# Altium footprint library Generic Footprint.PcbLib: 160 footprints (part 18 of 20) (continued)
## Symbol_FCC-Logo-15x10_Silkscreen [mil] (continued)
1(293.79,306.16) 1(293.79,306.83) 1(293.79,307.5) 1(293.79,373.09) 1(293.79,373.76) 1(293.79,374.42) 1(294.46,35.09) 1(294.46,35.76) 1(294.46,100.68) 1(294.46,102.02) 1(294.46,102.69) 1(294.46,145.53) 1(294.46,146.87) 1(294.46,148.2) 1(294.46,148.87) 1(294.46,149.54) 1(294.46,259.31) 1(294.46,259.98) 1(294.46,260.65) 1(294.46,263.32) 1(294.46,305.49) 1(294.46,306.83) 1(295.13,33.76) 1(295.13,34.42) 1(295.13,35.09) 1(295.13,100.02) 1(295.13,101.35) 1(295.13,102.02) 1(295.13,144.86) 1(295.13,146.87) 1(295.13,262.65) 1(295.13,306.16) 1(295.13,307.5) 1(295.13,308.17) 1(295.13,373.76) 1(295.13,374.42) 1(295.13,375.09) 1(295.8,33.09) 1(295.8,99.35) 1(295.8,100.68) 1(295.8,101.35) 1(295.8,143.52) 1(295.8,144.19) 1(295.8,144.86) 1(295.8,145.53) 1(295.8,262.65) 1(295.8,263.99) 1(295.8,264.66) 1(295.8,265.33) 1(295.8,306.83) 1(295.8,308.17) 1(295.8,308.83) 1(295.8,374.42) 1(295.8,375.76) 1(296.47,34.42) 1(296.47,98.68) 1(296.47,99.35) 1(296.47,100.02) 1(296.47,100.68) 1(296.47,142.18) 1(296.47,143.52) 1(296.47,144.86) 1(296.47,145.53) 1(296.47,264.66) 1(296.47,265.33) 1(296.47,266.67) 1(296.47,307.5) 1(296.47,308.17) 1(296.47,308.83) 1(296.47,376.43) 1(297.14,31.75) 1(297.14,32.42) 1(297.14,33.09) 1(297.14,100.02) 1(297.14,142.18) 1(297.14,142.85) 1(297.14,143.52) 1(297.14,264.66) 1(297.14,265.33) 1(297.14,266.67) 1(297.14,268.01) 1(297.14,268.68) 1(297.14,308.83) 1(297.81,32.42) 1(297.81,33.09) 1(297.81,98.68) 1(297.81,99.35) 1(297.81,140.17) 1(297.81,142.18) 1(297.81,266) 1(297.81,266.67) 1(297.81,268.01) 1(297.81,310.84) 1(297.81,377.1) 1(298.48,31.08) 1(298.48,97.34) 1(298.48,138.17) 1(298.48,138.83) 1(298.48,141.51) 1(298.48,267.34) 1(298.48,268.68) 1(298.48,270.02) 1(298.48,270.68) 1(298.48,309.5) 1(298.48,310.84) 1(298.48,311.51) 1(299.15,31.75) 1(299.15,32.42) 1(299.15,96) 1(299.15,96.67) 1(299.15,97.34) 1(299.15,98.68) 1(299.15,138.83) 1(299.15,140.17) 1(299.15,140.84) 1(299.15,268.01) 1(299.15,268.68) 1(299.15,269.35) 1(299.15,310.17) 1(299.15,312.18) 1(299.15,377.77) 1(299.82,31.75) 1(299.82,95.33) 1(299.82,96.67) 1(299.82,97.34) 1(299.82,98.01) 1(299.82,136.16) 1(299.82,136.83) 1(299.82,138.17) 1(299.82,139.5) 1(299.82,140.17) 1(299.82,270.02) 1(299.82,270.68) 1(299.82,271.35) 1(299.82,272.02) 1(299.82,272.69) 1(299.82,310.84) 1(299.82,311.51) 1(299.82,312.18) 1(299.82,312.85) 1(299.82,377.1) 1(299.82,378.44) 1(300.49,29.74) 1(300.49,30.41) 1(300.49,94.66) 1(300.49,96) 1(300.49,96.67) 1(300.49,135.49) 1(300.49,137.5) 1(300.49,138.17) 1(300.49,138.83) 1(300.49,270.02) 1(300.49,270.68) 1(300.49,273.36) 1(300.49,311.51) 1(300.49,312.18) 1(300.49,312.85) 1(300.49,313.52) 1(300.49,314.19) 1(300.49,377.1) 1(301.16,93.99) 1(301.16,95.33) 1(301.16,96) 1(301.16,134.15) 1(301.16,134.82) 1(301.16,274.03) 1(301.16,313.52) 1(301.16,377.77) 1(301.16,378.44) 1(301.16,379.11) 1(301.83,29.07) 1(301.83,94.66) 1(301.83,95.33) 1(301.83,133.48) 1(301.83,274.7) 1(301.83,275.37) 1(301.83,312.85) 1(301.83,314.19) 1(301.83,314.86) 1(302.49,93.99) 1(302.49,94.66) 1(302.49,132.81) 1(302.49,134.15) 1(302.49,134.82) 1(302.49,274.03) 1(302.49,274.7) 1(302.49,276.04) 1(302.49,313.52) 1(302.49,314.86) 1(302.49,377.77) 1(302.49,379.11) 1(302.49,379.78) 1(303.16,28.4) 1(303.16,29.74) 1(303.16,91.98) 1(303.16,92.65) 1(303.16,93.99) 1(303.16,133.48) 1(303.16,134.15) 1(303.16,134.82) 1(303.16,274.03) 1(303.16,274.7) 1(303.16,275.37) 1(303.16,314.19) 1(303.16,314.86) 1(303.16,378.44) 1(303.83,29.07) 1(303.83,29.74) 1(303.83,91.98) 1(303.83,92.65) 1(303.83,93.32) 1(303.83,130.13) 1(303.83,130.8) 1(303.83,132.81) 1(303.83,133.48) 1(303.83,275.37) 1(303.83,276.04) 1(303.83,277.38) 1(303.83,278.05) 1(303.83,315.53) 1(303.83,316.87) 1(303.83,379.11) 1(303.83,380.45) 1(304.5,92.65) 1(304.5,129.46) 1(304.5,130.8) 1(304.5,132.14) 1(304.5,132.81) 1(304.5,276.04) 1(304.5,276.71) 1(304.5,277.38) 1(304.5,278.05) 1(304.5,278.72) 1(304.5,316.87) 1(304.5,317.54) 1(304.5,381.12) 1(305.17,27.73) 1(305.17,28.4) 1(305.17,29.07) 1(305.17,131.47) 1(305.17,277.38) 1(305.17,279.39) 1(305.17,316.2) 1(305.17,317.54) 1(305.17,380.45) 1(305.84,89.98) 1(305.84,90.65) 1(305.84,91.98) 1(305.84,128.13) 1(305.84,128.79) 1(305.84,130.8) 1(305.84,278.05) 1(305.84,280.05) 1(305.84,280.72) 1(305.84,316.87) 1(305.84,381.79) 1(306.51,89.31) 1(306.51,90.65) 1(306.51,127.46) 1(306.51,128.79) 1(306.51,280.05) 1(306.51,281.39) 1(306.51,317.54) 1(306.51,318.87) 1(306.51,319.54) 1(306.51,380.45) 1(306.51,381.12) 1(306.51,382.46) 1(307.18,26.39) 1(307.18,27.06) 1(307.18,27.73) 1(307.18,28.4) 1(307.18,88.64) 1(307.18,89.98) 1(307.18,90.65) 1(307.18,91.31) 1(307.18,126.79) 1(307.18,127.46) 1(307.18,128.13) 1(307.18,128.79) 1(307.18,280.05) 1(307.18,280.72) 1(307.18,281.39) 1(307.18,282.06) 1(307.18,318.2) 1(307.18,318.87) 1(307.18,381.12) 1(307.85,25.72) 1(307.85,26.39) 1(307.85,27.06) 1(307.85,27.73) 1(307.85,87.97) 1(307.85,89.31) 1(307.85,89.98) 1(307.85,126.12) 1(307.85,126.79) 1(307.85,128.13) 1(307.85,280.72) 1(307.85,281.39) 1(307.85,282.06) 1(307.85,282.73) 1(307.85,318.87) 1(307.85,319.54) 1(307.85,320.21) 1(307.85,383.13) 1(308.52,26.39) 1(308.52,27.06) 1(308.52,88.64) 1(308.52,89.31) 1(308.52,125.45) 1(308.52,126.12) 1(308.52,127.46) 1(308.52,320.21) 1(308.52,320.88) 1(309.19,25.05) 1(309.19,87.97) 1(309.19,88.64) 1(309.19,125.45) 1(309.19,126.79) 1(309.19,282.06) 1(309.19,282.73) 1(309.19,284.07) 1(309.19,284.74) 1(309.19,319.54) 1(309.19,320.88) 1(309.86,86.63) 1(309.86,87.3) 1(309.86,122.77) 1(309.86,123.44) 1(309.86,124.11) 1(309.86,126.12) 1(309.86,282.73) 1(309.86,284.07) 1(309.86,284.74) 1(309.86,285.41) 1(309.86,320.21) 1(309.86,382.46) 1(309.86,383.8) 1(310.53,24.39) 1(310.53,87.3) 1(310.53,122.1) 1(310.53,123.44) 1(310.53,124.11) 1(310.53,124.78) 1(310.53,125.45) 1(310.53,283.4) 1(310.53,284.07) 1(310.53,284.74) 1(310.53,285.41) 1(310.53,286.08) 1(310.53,322.22) 1(310.53,382.46) 1(310.53,383.13) 1(311.2,86.63) 1(311.2,87.3) 1(311.2,87.97) 1(311.2,122.77) 1(311.2,123.44) 1(311.2,124.11) 1(311.2,285.41) 1(311.2,286.08) 1(311.2,286.75) 1(311.2,320.88) 1(311.2,322.22) 1(311.2,384.46) 1(311.86,23.72) 1(311.86,86.63) 1(311.86,121.43) 1(311.86,122.1) 1(311.86,287.42) 1(311.86,321.55) 1(311.86,323.56) 1(311.86,383.13) 1(311.86,383.8) 1(312.53,85.96) 1(312.53,120.76) 1(312.53,122.77) 1(312.53,286.08) 1(312.53,286.75) 1(312.53,288.09) 1(312.53,322.22) 1(312.53,323.56) 1(313.2,84.62) 1(313.2,120.09) 1(313.2,120.76) 1(313.2,121.43) 1(313.2,122.1) 1(313.2,286.75) 1(313.2,287.42) 1(313.2,288.76) 1(313.2,322.89) 1(313.2,324.23) 1(313.2,383.8) 1(313.2,385.13) 1(313.87,23.05) 1(313.87,24.39) 1(313.87,83.95) 1(313.87,84.62) 1(313.87,119.42) 1(313.87,120.09) 1(313.87,121.43) 1(313.87,287.42) 1(313.87,288.76) 1(313.87,289.42) 1(313.87,324.9) 1(313.87,384.46) 1(313.87,385.13) 1(313.87,385.8) 1(314.54,22.38) 1(314.54,24.39) 1(314.54,83.28) 1(314.54,83.95) 1(314.54,85.29) 1(314.54,118.76) 1(314.54,119.42) 1(314.54,120.09) 1(314.54,120.76) 1(314.54,288.76) 1(314.54,289.42) 1(314.54,290.09) 1(314.54,323.56) 1(314.54,324.23) 1(314.54,324.9) 1(314.54,384.46) 1(314.54,385.13) 1(315.21,23.05) 1(315.21,23.72) 1(315.21,82.61) 1(315.21,83.28) 1(315.21,83.95) 1(315.21,84.62) 1(315.21,118.09) 1(315.21,290.76) 1(315.21,324.23) 1(315.21,326.24) 1(315.21,385.13) 1(315.21,385.8) 1(315.21,386.47) 1(315.88,23.72) 1(315.88,81.94) 1(315.88,82.61) 1(315.88,83.28) 1(315.88,117.42) 1(315.88,118.76) 1(315.88,119.42) 1(315.88,289.42) 1(315.88,290.09) 1(315.88,291.43) 1(315.88,324.9) 1(315.88,326.24) 1(315.88,385.13) 1(316.55,21.71) 1(316.55,22.38) 1(316.55,23.05) 1(316.55,116.08) 1(316.55,116.75) 1(316.55,118.76) 1(316.55,290.09) 1(316.55,290.76) 1(316.55,291.43) 1(316.55,292.1) 1(316.55,385.8) 1(316.55,386.47) 1(316.55,387.14) 1(317.22,81.94) 1(317.22,115.41) 1(317.22,116.75) 1(317.22,290.76) 1(317.22,292.1) 1(317.22,292.77) 1(317.22,325.57) 1(317.89,82.61) 1(317.89,116.08) 1(317.89,116.75) 1(317.89,291.43) 1(317.89,292.1) 1(317.89,292.77) 1(317.89,293.44) 1(317.89,326.24) 1(317.89,386.47) 1(317.89,387.14) 1(317.89,387.81) 1(318.56,21.04) 1(318.56,21.71) 1(318.56,22.38) 1(318.56,114.74) 1(318.56,115.41) 1(318.56,294.11) 1(318.56,327.57) 1(319.23,81.94) 1(319.23,114.07) 1(319.23,114.74) 1(319.23,116.08) 1(319.23,292.77) 1(319.23,293.44) 1(319.23,294.78) 1(319.23,326.91) 1(319.23,327.57) 1(319.23,328.24) 1(319.23,387.14) 1(319.23,388.48) 1(319.9,20.37) 1(319.9,21.71) 1(319.9,81.28) 1(319.9,113.4) 1(319.9,114.07) 1(319.9,115.41) 1(319.9,293.44) 1(319.9,294.11) 1(319.9,295.45) 1(319.9,327.57) 1(319.9,328.24) 1(319.9,329.58) 1(320.57,21.04) 1(320.57,80.61) 1(320.57,112.73) 1(320.57,113.4) 1(320.57,114.74) 1(320.57,294.11) 1(320.57,295.45) 1(320.57,296.12) 1(320.57,328.24) 1(321.23,19.7) 1(321.23,21.04) 1(321.23,78.6) 1(321.23,112.06) 1(321.23,112.73) 1(321.23,113.4) 1(321.23,114.07) 1(321.23,295.45) 1(321.23,296.12) 1(321.23,296.79) 1(321.23,329.58) 1(321.23,330.25) 1(321.23,389.15) 1(321.9,19.03) 1(321.9,79.94) 1(321.9,111.39) 1(321.9,297.46) 1(321.9,328.91) 1(322.57,77.93) 1(322.57,78.6) 1(322.57,79.27) 1(322.57,112.06) 1(322.57,112.73) 1(322.57,296.12) 1(322.57,296.79) 1(322.57,329.58) 1(322.57,330.25) 1(322.57,330.92) 1(322.57,389.82) 1(323.24,18.36) 1(323.24,77.26) 1(323.24,110.05) 1(323.24,110.72) 1(323.24,111.39) 1(323.24,389.15) 1(323.91,77.26) 1(323.91,77.93) 1(323.91,78.6) 1(323.91,111.39) 1(323.91,112.06) 1(323.91,296.79) 1(323.91,297.46) 1(323.91,298.8) 1(323.91,330.25) 1(323.91,330.92) 1(323.91,389.15) 1(324.58,75.92) 1(324.58,77.93) 1(324.58,109.39) 1(324.58,110.05) 1(324.58,297.46) 1(324.58,298.13) 1(324.58,298.8) 1(324.58,299.46) 1(324.58,389.82) 1(324.58,390.49) 1(325.25,19.03) 1(325.25,108.72) 1(325.25,109.39) 1(325.25,300.13) 1(325.25,330.92) 1(325.92,17.69) 1(325.92,19.03) 1(325.92,75.92) 1(325.92,77.26) 1(325.92,110.05) 1(325.92,298.8) 1(325.92,299.46) 1(325.92,300.8) 1(325.92,331.59) 1(326.59,18.36) 1(326.59,75.25) 1(326.59,108.05) 1(326.59,109.39) 1(326.59,299.46) 1(326.59,300.13) 1(326.59,389.82) 1(326.59,390.49) 1(326.59,391.16) 1(327.26,76.59) 1(327.26,107.38) 1(327.26,108.72) 1(327.26,300.13) 1(327.26,301.47) 1(327.26,332.26) 1(327.26,333.6) 1(327.93,75.25) 1(327.93,106.04) 1(327.93,106.71) 1(327.93,107.38) 1(327.93,108.05) 1(327.93,108.72) 1(327.93,302.14) 1(327.93,333.6) 1(327.93,334.27) 1(327.93,390.49) 1(327.93,391.16) 1(327.93,391.83) 1(328.6,17.02) 1(328.6,18.36) 1(328.6,75.92) 1(328.6,108.05) 1(328.6,302.81) 1(328.6,332.93) 1(329.27,16.35) 1(329.27,17.69) 1(329.27,75.25) 1(329.27,105.37) 1(329.27,107.38) 1(329.27,302.14) 1(329.27,334.27) 1(329.27,392.5) 1(329.94,16.35) 1(329.94,17.69) 1(329.94,197.06) 1(329.94,197.73) 1(329.94,198.4) 1(329.94,199.07) 1(329.94,199.74) 1(329.94,200.41) 1(329.94,201.08) 1(329.94,201.75) 1(329.94,202.42) 1(329.94,203.09) 1(329.94,203.76) 1(329.94,204.42) 1(329.94,205.09) 1(329.94,205.76) 1(329.94,206.43) 1(329.94,207.1) 1(329.94,207.77) 1(329.94,208.44) 1(329.94,209.11) 1(329.94,209.78) 1(329.94,210.45) 1(329.94,211.12) 1(329.94,303.48) 1(329.94,333.6) 1(329.94,334.94) 1(329.94,335.61) 1(330.61,15.68) 1(330.61,17.02) 1(330.61,74.58) 1(330.61,104.7) 1(330.61,105.37) 1(330.61,106.04) 1(330.61,192.38) 1(330.61,193.05) 1(330.61,193.72) 1(330.61,194.39) 1(330.61,195.05) 1(330.61,195.72) 1(330.61,196.39) 1(330.61,197.73) 1(330.61,198.4) 1(330.61,199.07) 1(330.61,199.74) 1(330.61,200.41) 1(330.61,201.08) 1(330.61,201.75) 1(330.61,202.42) 1(330.61,203.09) 1(330.61,203.76) 1(330.61,204.42) 1(330.61,205.09) 1(330.61,205.76) 1(330.61,206.43) 1(330.61,207.1) 1(330.61,207.77) 1(330.61,208.44) 1(330.61,209.11) 1(330.61,209.78) 1(330.61,210.45) 1(330.61,211.12) 1(330.61,211.79) 1(330.61,212.46) 1(330.61,213.13) 1(330.61,213.79) 1(330.61,214.46) 1(330.61,215.13) 1(330.61,215.8) 1(330.61,216.47) 1(330.61,302.14) 1(330.61,302.81) 1(330.61,304.15) 1(330.61,334.27) 1(330.61,335.61) 1(330.61,391.16) 1(330.61,391.83) 1(330.61,392.5) 1(330.61,393.17) 1(331.27,72.57) 1(331.27,73.91) 1(331.27,106.04) 1(331.27,192.38) 1(331.27,193.05) 1(331.27,193.72) 1(331.27,194.39) 1(331.27,195.05) 1(331.27,195.72) 1(331.27,196.39) 1(331.27,197.73) 1(331.27,198.4) 1(331.27,199.07) 1(331.27,199.74) 1(331.27,200.41) 1(331.27,201.08) 1(331.27,201.75) 1(331.27,202.42) 1(331.27,203.09) 1(331.27,203.76) 1(331.27,204.42) 1(331.27,205.09) 1(331.27,205.76) 1(331.27,206.43) 1(331.27,207.1) 1(331.27,207.77) 1(331.27,208.44) 1(331.27,209.11) 1(331.27,209.78) 1(331.27,210.45) 1(331.27,211.12) 1(331.27,212.46) 1(331.27,213.13) 1(331.27,213.79) 1(331.27,214.46) 1(331.27,215.13) 1(331.27,215.8) 1(331.27,216.47) 1(331.27,302.81) 1(331.27,303.48) 1(331.27,304.82) 1(331.27,334.94) 1(331.27,336.28) 1(331.94,104.03) 1(331.94,192.38) 1(331.94,193.05) 1(331.94,193.72) 1(331.94,194.39) 1(331.94,195.05) 1(331.94,195.72) 1(331.94,213.13) 1(331.94,213.79) 1(331.94,214.46) 1(331.94,215.13) 1(331.94,215.8) 1(331.94,303.48) 1(331.94,304.15) 1(331.94,305.49) 1(331.94,334.94) 1(331.94,391.83) 1(331.94,392.5) 1(332.61,15.02) 1(332.61,15.68) 1(332.61,16.35) 1(332.61,17.02) 1(332.61,71.91) 1(332.61,72.57) 1(332.61,73.24) 1(332.61,103.36) 1(332.61,105.37) 1(332.61,183.68) 1(332.61,185.02) 1(332.61,196.39) 1(332.61,212.46) 1(332.61,216.47) 1(332.61,223.83) 1(332.61,225.17) 1(332.61,304.82) 1(332.61,336.28) 1(332.61,336.94) 1(332.61,393.83) 1(333.28,102.69) 1(333.28,103.36) 1(333.28,104.03) 1(333.28,181) 1(333.28,181.67) 1(333.28,182.34) 1(333.28,183.68) 1(333.28,185.02) 1(333.28,188.36) 1(333.28,189.03) 1(333.28,189.7) 1(333.28,190.37) 1(333.28,191.04) 1(333.28,191.71) 1(333.28,217.14) 1(333.28,217.81) 1(333.28,218.48) 1(333.28,219.15) 1(333.28,219.82) 1(333.28,223.83) 1(333.28,225.17) 1(333.28,225.84) 1(333.28,226.51) 1(333.28,227.18) 1(333.28,227.85) 1(333.28,304.15) 1(333.28,304.82) 1(333.28,306.16) 1(333.28,335.61) 1(333.28,336.94) 1(333.28,337.61) 1(333.95,71.24) 1(333.95,72.57) 1(333.95,178.99) 1(333.95,179.66) 1(333.95,180.33) 1(333.95,181) 1(333.95,181.67) 1(333.95,182.34) 1(333.95,185.68) 1(333.95,186.35) 1(333.95,187.02) 1(333.95,187.69) 1(333.95,220.49) 1(333.95,221.16) 1(333.95,221.83) 1(333.95,222.5) 1(333.95,223.17) 1(333.95,225.84) 1(333.95,226.51) 1(333.95,227.18) 1(333.95,227.85) 1(333.95,228.52) 1(333.95,229.19) 1(333.95,229.86) 1(333.95,306.83) 1(333.95,336.28) 1(333.95,394.5) 1(334.62,14.35) 1(334.62,15.02) 1(334.62,15.68) 1(334.62,71.91) 1(334.62,102.02) 1(334.62,102.69) 1(334.62,103.36) 1(334.62,104.03) 1(334.62,177.65) 1(334.62,178.32) 1(334.62,178.99) 1(334.62,179.66) 1(334.62,180.33) 1(334.62,182.34) 1(334.62,183.01) 1(334.62,183.68) 1(334.62,184.35) 1(334.62,185.02) 1(334.62,223.83) 1(334.62,224.5) 1(334.62,225.17) 1(334.62,225.84) 1(334.62,226.51) 1(334.62,228.52) 1(334.62,229.19) 1(334.62,229.86) 1(334.62,230.53) 1(334.62,231.2) 1(334.62,337.61) 1(335.29,71.24) 1(335.29,101.35) 1(335.29,176.98) 1(335.29,178.99) 1(335.29,180.33) 1(335.29,181) 1(335.29,181.67) 1(335.29,227.18) 1(335.29,227.85) 1(335.29,228.52) 1(335.29,229.86) 1(335.29,231.87) 1(335.29,307.5) 1(335.96,69.9) 1(335.96,70.57) 1(335.96,71.91) 1(335.96,102.02) 1(335.96,102.69) 1(335.96,175.65) 1(335.96,176.31) 1(335.96,176.98) 1(335.96,177.65) 1(335.96,178.32) 1(335.96,179.66) 1(335.96,229.19) 1(335.96,230.53) 1(335.96,231.2) 1(335.96,232.54) 1(335.96,233.2) 1(335.96,306.83) 1(335.96,336.94) 1(336.63,15.02) 1(336.63,69.9) 1(336.63,70.57) 1(336.63,174.31) 1(336.63,174.98) 1(336.63,175.65) 1(336.63,176.98) 1(336.63,177.65) 1(336.63,178.32) 1(336.63,230.53) 1(336.63,231.2) 1(336.63,232.54) 1(336.63,233.87) 1(336.63,234.54) 1(336.63,308.17) 1(336.63,395.17) 1(337.3,13.68) 1(337.3,69.23) 1(337.3,69.9) 1(337.3,71.24) 1(337.3,100.02) 1(337.3,100.68) 1(337.3,102.02) 1(337.3,173.64) 1(337.3,174.31) 1(337.3,174.98) 1(337.3,175.65) 1(337.3,232.54) 1(337.3,233.87) 1(337.3,234.54) 1(337.3,235.21) 1(337.3,306.83) 1(337.3,337.61) 1(337.97,13.01) 1(337.97,69.9) 1(337.97,70.57) 1(337.97,99.35) 1(337.97,174.31) 1(337.97,174.98) 1(337.97,233.87) 1(337.97,234.54) 1(337.97,308.17) 1(337.97,308.83) 1(337.97,309.5) 1(337.97,338.28) 1(337.97,395.84) 1(338.64,12.34) 1(338.64,69.23) 1(338.64,170.29) 1(338.64,172.3) 1(338.64,236.55) 1(338.64,308.83) 1(338.64,394.5) 1(339.31,98.68) 1(339.31,168.28) 1(339.31,168.95) 1(339.31,169.62) 1(339.31,170.29) 1(339.31,172.97) 1(339.31,235.88) 1(339.31,239.23) 1(339.31,239.9) 1(339.31,240.57) 1(339.31,308.17) 1(339.31,309.5) 1(339.31,339.62) 1(339.98,69.9) 1(339.98,99.35) 1(339.98,167.61) 1(339.98,168.95) 1(339.98,169.62) 1(339.98,170.29) 1(339.98,170.96) 1(339.98,171.63) 1(339.98,237.22) 1(339.98,237.89) 1(339.98,239.23) 1(339.98,239.9) 1(339.98,241.24) 1(339.98,241.91) 1(339.98,308.83) 1(339.98,310.17) 1(339.98,338.95) 1(339.98,339.62) 1(339.98,340.29) 1(339.98,394.5) 1(340.64,166.28) 1(340.64,166.94) 1(340.64,167.61) 1(340.64,168.28) 1(340.64,168.95) 1(340.64,169.62) 1(340.64,238.56) 1(340.64,239.23) 1(340.64,241.24) 1(340.64,242.57) 1(340.64,395.17) 1(340.64,395.84) 1(340.64,396.51) 1(341.31,69.23) 1(341.31,98.01) 1(341.31,98.68) 1(341.31,99.35) 1(341.31,166.28) 1(341.31,166.94) 1(341.31,167.61) 1(341.31,168.28) 1(341.31,239.9) 1(341.31,241.24) 1(341.31,241.91) 1(341.31,243.24) 1(341.31,309.5) 1(341.31,310.17) 1(341.31,310.84) 1(341.31,339.62) 1(341.31,340.29) 1(341.31,340.96) 1(341.98,11.67) 1(341.98,67.89) 1(341.98,164.94) 1(341.98,165.61) 1(341.98,166.94) 1(341.98,243.91) 1(342.65,67.22) 1(342.65,67.89) 1(342.65,68.56) 1(342.65,98.01) 1(342.65,98.68) 1(342.65,163.6) 1(342.65,164.27) 1(342.65,164.94) 1(342.65,166.28) 1(342.65,241.91) 1(342.65,243.91) 1(342.65,244.58) 1(342.65,245.25) 1(342.65,310.17) 1(342.65,311.51) 1(342.65,340.29) 1(342.65,340.96) 1(342.65,341.63) 1(342.65,395.17) 1(342.65,396.51) 1(342.65,397.18) 1(343.32,66.55) 1(343.32,96.67) 1(343.32,163.6) 1(343.32,164.27) 1(343.32,164.94) 1(343.32,244.58) 1(343.32,312.18) 1(343.32,342.3) 1(343.32,395.84) 1(343.99,12.34) 1(343.99,96) 1(343.99,97.34) 1(343.99,98.01) 1(343.99,163.6) 1(343.99,164.27) 1(343.99,243.91) 1(343.99,244.58) 1(343.99,312.18) 1(343.99,312.85) 1(343.99,340.96) 1(344.66,67.89) 1(344.66,96.67) 1(344.66,97.34) 1(344.66,162.93) 1(344.66,312.18) 1(344.66,341.63) 1(344.66,342.3) 1(344.66,342.97) 1(344.66,397.85) 1(345.33,11) 1(345.33,12.34) 1(345.33,65.88) 1(345.33,66.55) 1(345.33,95.33) 1(345.33,97.34) 1(345.33,160.25) 1(345.33,245.92) 1(345.33,247.26) 1(345.33,248.6) 1(345.33,313.52) 1(345.33,341.63) 1(345.33,396.51) 1(345.33,397.18) 1(346,11.67) 1(346,96) 1(346,96.67) 1(346,158.91) 1(346,159.58) 1(346,162.26) 1(346,246.59) 1(346,247.93) 1(346,248.6) 1(346,249.27) 1(346,312.85) 1(346.67,65.21) 1(346.67,65.88) 1(346.67,66.55) 1(346.67,158.24) 1(346.67,159.58) 1(346.67,160.92) 1(346.67,161.59) 1(346.67,248.6) 1(346.67,249.27) 1(346.67,249.94) 1(346.67,250.61) 1(346.67,314.19) 1(346.67,342.97) 1(346.67,343.64) 1(347.34,94.66) 1(347.34,96) 1(347.34,156.91) 1(347.34,157.57) 1(347.34,158.91) 1(347.34,159.58) 1(347.34,249.27) 1(347.34,249.94) 1(347.34,250.61) 1(347.34,251.28) 1(347.34,251.94) 1(347.34,342.3) 1(348.01,10.33) 1(348.01,11) 1(348.01,11.67) 1(348.01,64.54) 1(348.01,65.21) 1(348.01,157.57) 1(348.01,158.24) 1(348.01,158.91) 1(348.01,249.94) 1(348.01,250.61) 1(348.01,251.28) 1(348.01,251.94) 1(348.01,312.85) 1(348.01,313.52) 1(348.01,343.64) 1(348.01,397.18) 1(348.01,397.85) 1(348.01,398.52) 1(348.68,10.33) 1(348.68,65.88) 1(348.68,93.99) 1(348.68,95.33) 1(348.68,156.24) 1(348.68,158.24) 1(348.68,251.28) 1(348.68,252.61) 1(348.68,314.86) 1(349.35,10.33) 1(349.35,93.32) 1(349.35,95.33) 1(349.35,156.24) 1(349.35,157.57) 1(349.35,251.94) 1(349.35,252.61) 1(349.35,253.28) 1(349.35,313.52) 1(349.35,314.19) 1(350.01,9.66) 1(350.01,63.87) 1(350.01,64.54) 1(350.01,156.24) 1(350.01,252.61) 1(350.01,253.28) 1(350.01,253.95) 1(350.01,314.86) 1(350.01,315.53) 1(350.01,342.97) 1(350.01,399.19) 1(350.68,8.99) 1(350.68,11) 1(350.68,63.2) 1(350.68,65.21) 1(350.68,93.99) 1(350.68,94.66) 1(350.68,154.23) 1(350.68,155.57) 1(350.68,253.28) 1(350.68,253.95) 1(350.68,254.62) 1(350.68,255.29) 1(350.68,314.19) 1(350.68,314.86) 1(350.68,315.53) 1(350.68,316.2) 1(350.68,397.85) 1(350.68,399.86) 1(351.35,9.66) 1(351.35,10.33) 1(351.35,92.65) 1(351.35,93.32) 1(351.35,93.99) 1(351.35,94.66) 1(351.35,152.89) 1(351.35,153.56) 1(351.35,154.23) 1(351.35,154.9) 1(351.35,253.95) 1(351.35,254.62) 1(351.35,314.86) 1(351.35,343.64) 1(352.02,63.2) 1(352.02,63.87) 1(352.02,153.56) 1(352.02,154.23) 1(352.02,254.62) 1(352.02,255.29) 1(352.02,255.96) 1(352.69,64.54) 1(352.69,91.98) 1(352.69,92.65) 1(352.69,151.55) 1(352.69,152.22) 1(352.69,152.89) 1(352.69,153.56) 1(352.69,255.29) 1(352.69,255.96) 1(352.69,256.63) 1(352.69,314.86) 1(352.69,315.53) 1(352.69,316.2) 1(353.36,10.33) 1(353.36,93.32) 1(353.36,150.88) 1(353.36,152.22) 1(353.36,152.89) 1(353.36,255.96) 1(353.36,256.63) 1(353.36,257.3) 1(353.36,316.87) 1(353.36,344.31) 1(353.36,400.53) 1(354.03,8.32) 1(354.03,8.99) 1(354.03,9.66) 1(354.03,63.87) 1(354.03,150.88) 1(354.03,151.55) 1(354.03,152.22) 1(354.03,256.63) 1(354.03,257.3) 1(354.03,344.98) 1(354.03,346.31) 1(354.7,91.31) 1(354.7,91.98) 1(354.7,92.65) 1(354.7,151.55) 1(354.7,257.3) 1(354.7,316.2) 1(354.7,316.87) 1(354.7,317.54) 1(355.37,150.88) 1(355.37,257.97) 1(355.37,259.31) 1(356.04,61.87) 1(356.04,63.2) 1(356.04,258.64) 1(356.04,259.31) 1(356.04,259.98) 1(356.04,316.87) 1(356.04,318.2) 1(356.04,345.65) 1(356.04,346.31) 1(356.04,346.98) 1(356.04,399.86) 1(356.71,7.65) 1(356.71,8.99) 1(356.71,89.98) 1(356.71,90.65) 1(356.71,91.31) 1(356.71,91.98) 1(356.71,148.87) 1(356.71,150.21) 1(356.71,318.87) 1(356.71,399.86) 1(356.71,401.2) 1(357.38,148.87) 1(357.38,149.54) 1(357.38,259.31) 1(357.38,259.98) 1(357.38,260.65) 1(358.05,89.31) 1(358.05,89.98) 1(358.05,90.65) 1(358.05,91.31) 1(358.05,260.65) 1(358.05,261.31) 1(358.05,319.54) 1(358.05,346.98) 1(358.05,347.65) 1(358.05,399.86) 1(358.72,61.2) 1(358.72,61.87) 1(358.72,89.98) 1(358.72,90.65) 1(358.72,148.2) 1(358.72,148.87) 1(358.72,259.98) 1(358.72,261.31) 1(358.72,346.31) 1(358.72,399.86) 1(359.38,62.54) 1(359.38,146.2) 1(359.38,146.87) 1(359.38,147.54) 1(359.38,260.65) 1(359.38,261.31) 1(359.38,400.53) 1(360.05,145.53) 1(360.05,146.87) 1(360.05,348.32) 1(360.05,401.87) 1(360.72,6.98) 1(360.72,60.53) 1(360.72,88.64) 1(360.72,146.2) 1(360.72,146.87) 1(360.72,261.98) 1(360.72,318.87) 1(360.72,320.21) 1(360.72,346.98) 1(360.72,347.65) 1(360.72,348.99) 1(360.72,401.87) 1(361.39,59.86) 1(361.39,61.2) 1(361.39,61.87) 1(361.39,145.53) 1(361.39,146.2) 1(361.39,318.87) 1(362.06,262.65) 1(362.06,263.99) 1(362.06,319.54) 1(362.73,87.97) 1(362.73,263.99) 1(362.73,400.53) 1(362.73,401.87) 1(363.4,6.31) 1(363.4,145.53) 1(363.4,263.32) 1(363.4,265.33) 1(363.4,319.54) 1(363.4,347.65) 1(363.4,348.32) 1(363.4,348.99) 1(363.4,401.2) 1(363.4,402.54) 1(364.07,59.19) 1(364.07,59.86) 1(364.07,60.53) 1(364.07,61.2) 1(364.07,144.19) 1(364.07,144.86) 1(364.07,263.99) 1(364.07,265.33) 1(364.07,266) 1(364.07,320.21) 1(364.07,320.88) 1(364.07,349.66) 1(364.74,60.53) 1(364.74,87.3) 1(364.74,88.64) 1(364.74,142.85) 1(364.74,264.66) 1(365.41,142.18) 1(365.41,142.85) 1(365.41,143.52) 1(365.41,266) 1(365.41,266.67) 1(366.08,59.19) 1(366.08,88.64) 1(366.08,265.33) 1(366.08,266.67) 1(366.08,267.34) 1(366.08,320.21) 1(366.08,320.88) 1(366.08,348.32) 1(366.08,349.66) 1(366.75,58.52) 1(366.75,59.86) 1(366.75,141.51) 1(366.75,142.18) 1(366.75,266) 1(366.75,322.22) 1(366.75,350.33) 1(366.75,401.2) 1(366.75,401.87) 1(366.75,402.54) 1(366.75,403.2) 1(367.42,5.65) 1(367.42,86.63) 1(367.42,87.97) 1(367.42,140.84) 1(367.42,142.18) 1(367.42,142.85) 1(368.09,6.31) 1(368.09,6.98) 1(368.09,140.17) 1(368.09,141.51) 1(368.09,266.67) 1(368.09,267.34) 1(368.09,350.33) 1(368.75,6.98) 1(368.75,85.96) 1(368.75,86.63) 1(368.75,87.97) 1(368.75,320.88) 1(368.75,322.22) 1(369.42,87.3) 1(369.42,139.5) 1(369.42,140.17) 1(369.42,141.51) 1(369.42,267.34) 1(369.42,322.89) 1(369.42,348.99) 1(370.09,6.98) 1(370.09,57.85) 1(370.09,58.52) 1(370.76,59.19) 1(370.76,138.83) 1(370.76,139.5) 1(370.76,268.01) 1(370.76,321.55) 1(370.76,401.87) 1(371.43,6.31) 1(371.43,6.98) 1(371.43,87.3) 1(371.43,140.17) 1(371.43,322.22) 1(371.43,322.89) 1(371.43,323.56) 1(371.43,402.54) 1(371.43,403.2) 1(371.43,403.87) 1(372.1,4.98) 1(372.1,5.65) 1(372.1,85.29) 1(372.1,85.96) 1(372.1,86.63) 1(372.1,138.83) 1(372.1,268.68) 1(372.1,270.02) 1(372.77,57.85) 1(372.77,138.17) 1(372.77,349.66) 1(373.44,138.17) 1(373.44,139.5) 1(373.44,269.35) 1(373.44,270.02) 1(373.44,270.68) 1(373.44,351) 1(374.11,322.89) 1(374.11,324.23) 1(374.78,84.62) 1(374.78,85.29) 1(374.78,85.96) 1(374.78,271.35) 1(374.78,351) 1(375.45,270.02) 1(375.45,270.68) 1(375.45,272.02) 1(375.45,351) 1(375.45,404.54) 1(376.12,138.83) 1(376.12,351) 1(376.12,403.2) 1(376.12,403.87) 1(376.79,58.52) 1(376.79,138.17) 1(376.79,270.68) 1(376.79,271.35) 1(376.79,272.02) 1(376.79,350.33) 1(376.79,351.67) 1(376.79,352.34) 1(377.46,4.31) 1(377.46,4.98) 1(377.46,5.65) 1(377.46,136.16) 1(377.46,137.5) 1(377.46,272.69) 1(378.12,271.35) 1(378.12,323.56) 1(378.12,324.9) 1(378.79,83.95) 1(378.79,84.62) 1(378.79,85.29) 1(378.79,272.02) 1(378.79,272.69) 1(378.79,273.36) 1(378.79,323.56) 1(379.46,83.28) 1(379.46,135.49) 1(379.46,136.16) 1(379.46,136.83) 1(379.46,323.56) 1(380.8,273.36) 1(380.8,323.56) 1(380.8,351) 1(380.8,352.34) 1(380.8,353.01) 1(381.47,57.85) 1(381.47,134.82) 1(381.47,135.49) 1(381.47,272.69) 1(381.47,274.03) 1(381.47,325.57) 1(382.14,55.84) 1(382.14,57.18) 1(382.14,82.61) 1(382.14,84.62) 1(382.14,136.16) 1(382.14,274.03) 1(382.14,324.23) 1(382.14,403.87) 1(382.14,405.21) 1(382.81,3.64) 1(382.81,4.98) 1(382.81,55.84) 1(382.81,274.03) 1(383.48,4.31) 1(383.48,134.15) 1(383.48,274.03) 1(383.48,324.23) 1(384.15,55.84) 1(384.15,133.48) 1(384.15,134.82) 1(384.15,135.49) 1(384.82,324.23) 1(385.49,324.23) 1(385.49,326.24) 1(386.16,55.84) 1(386.16,325.57) 1(386.83,55.84) 1(386.83,133.48) 1(386.83,134.15) 1(386.83,134.82) 1(386.83,273.36) 1(386.83,352.34) 1(386.83,353.01) 1(386.83,353.68) 1(387.49,55.84) 1(387.49,81.94) 1(387.49,132.81) 1(388.16,55.17) 1(388.16,56.51) 1(389.5,132.81) 1(390.17,132.81) 1(390.17,274.03) 1(390.17,405.88) 1(390.84,132.81) 1(390.84,134.15) 1(390.84,274.7) 1(390.84,276.04) 1(391.51,406.55) 1(392.18,132.14) 1(392.18,325.57) 1(392.18,326.24) 1(392.18,326.91) 1(392.85,132.14) 1(393.52,2.3) 1(393.52,2.97) 1(393.52,3.64) 1(393.52,4.31) 1(394.19,81.28) 1(394.19,82.61) 1(394.19,132.14) 1(395.53,132.14) 1(396.2,132.14) 1(396.2,275.37) 1(396.2,276.04) 1(396.2,276.71) 1(396.86,133.48) 1(397.53,132.14) 1(397.53,353.01) 1(398.2,353.68) 1(398.2,354.35) 1(407.57,353.01) 1(408.24,353.68) 1(408.24,354.35) 1(408.91,132.14) 1(408.91,133.48) 1(409.58,132.14) 1(410.25,275.37) 1(410.25,276.04) 1(410.25,276.71) 1(410.92,81.28) 1(410.92,82.61) 1(410.92,132.14) 1(411.59,3.64) 1(412.26,2.3) 1(412.26,4.31) 1(412.26,132.14) 1(412.93,2.97) 1(412.93,132.14) 1(412.93,325.57) 1(412.93,326.24) 1(413.6,326.91) 1(414.27,132.14) 1(414.27,406.55) 1(414.94,132.81) 1(414.94,134.15) 1(414.94,405.88) 1(415.61,132.81) 1(415.61,274.7) 1(415.61,276.04) 1(416.27,274.03) 1(416.94,132.81) 1(417.61,55.17) 1(417.61,55.84) 1(417.61,56.51) 1(418.28,55.84) 1(418.28,81.94) 1(418.28,132.81) 1(418.95,55.84) 1(418.95,133.48) 1(418.95,134.15) 1(418.95,134.82) 1(418.95,352.34) 1(418.95,353.01) 1(418.95,353.68) 1(419.62,324.9) 1(419.62,325.57) 1(420.29,324.23) 1(420.29,326.24) 1(420.96,273.36) 1(420.96,324.9) 1(421.63,55.84) 1(421.63,133.48) 1(421.63,134.15) 1(421.63,134.82) 1(421.63,135.49) 1(421.63,324.23) 1(422.3,55.84) 1(422.97,3.64) 1(422.97,4.31) 1(422.97,4.98) 1(422.97,55.84) 1(422.97,82.61) 1(422.97,324.23) 1(422.97,403.87) 1(423.64,57.18) 1(423.64,84.62) 1(423.64,272.69) 1(423.64,274.03) 1(423.64,324.23) 1(423.64,405.21) 1(424.31,57.85) 1(424.31,134.82) 1(424.31,135.49) 1(424.31,136.16) 1(424.31,272.69) 1(424.31,325.57) 1(424.98,272.69) 1(424.98,274.03) 1(424.98,323.56) 1(424.98,351) 1(424.98,352.34) 1(424.98,353.01) 1(425.64,273.36) 1(425.64,323.56) 1(426.31,135.49) 1(426.31,136.16) 1(426.31,136.83) 1(426.31,323.56) 1(426.98,83.28) 1(426.98,83.95) 1(426.98,84.62) 1(426.98,85.29) 1(426.98,324.23) 1(427.65,272.02) 1(427.65,272.69) 1(427.65,273.36) 1(427.65,323.56) 1(427.65,324.23) 1(427.65,324.9) 1(428.32,58.52) 1(428.32,136.16) 1(428.32,136.83) 1(428.32,137.5) 1(428.32,138.17) 1(428.99,4.98) 1(428.99,5.65) 1(428.99,136.83) 1(428.99,350.33) 1(428.99,352.34) 1(428.99,403.2) 1(428.99,403.87) 1(429.66,4.31) 1(429.66,272.02) 1(429.66,272.69) 1(429.66,351.67) 1(429.66,404.54) 1(430.33,85.29) 1(430.33,138.83) 1(430.33,270.68) 1(431,84.62) 1(431,85.96) 1(431,322.89) 1(431.67,272.02) 1(431.67,324.23) 1(431.67,351) 1(432.34,138.17) 1(432.34,139.5) 1(432.34,270.02) 1(432.34,270.68) 1(432.34,271.35) 1(432.34,351) 1(433.01,57.85) 1(433.01,138.17) 1(433.01,349.66) 1(433.68,85.29) 1(433.68,85.96) 1(433.68,86.63) 1(433.68,138.83) 1(433.68,140.17) 1(433.68,269.35) 1(433.68,270.02) 1(433.68,270.68) 1(433.68,322.89) 1(434.35,5.65) 1(434.35,6.31) 1(434.35,87.3) 1(434.35,322.22) 1(434.35,323.56) 1(434.35,402.54) 1(434.35,403.2) 1(434.35,403.87) 1(435.01,4.98) 1(435.01,6.98) 1(435.01,59.19) 1(435.01,138.83) 1(435.01,139.5) 1(435.01,268.68) 1(435.01,270.02) 1(435.01,321.55) 1(435.01,401.87) 1(435.68,6.98) 1(435.68,57.85) 1(435.68,58.52) 1(435.68,140.84) 1(436.35,6.98) 1(436.35,85.96) 1(436.35,86.63) 1(436.35,87.3) 1(436.35,139.5) 1(436.35,140.84) 1(436.35,268.01) 1(436.35,320.88) 1(436.35,322.22) 1(436.35,322.89) 1(436.35,350.33) 1(437.02,87.3) 1(437.02,87.97) 1(437.02,140.17) 1(437.02,141.51) 1(437.02,267.34) 1(437.02,268.68) 1(437.02,348.99) 1(437.02,350.33) 1(437.69,140.17) 1(437.69,140.84) 1(437.69,142.18) 1(437.69,268.68) 1(438.36,6.98) 1(438.36,58.52) 1(438.36,59.86) 1(438.36,86.63) 1(438.36,87.3) 1(438.36,141.51) 1(438.36,142.85) 1(438.36,268.01) 1(438.36,350.33) 1(438.36,403.2) 1(439.03,5.65) 1(439.03,6.31) 1(439.03,59.19) 1(439.03,87.97) 1(439.03,88.64) 1(439.03,141.51) 1(439.03,142.18) 1(439.03,266.67) 1(439.03,267.34) 1(439.03,268.01) 1(439.03,321.55) 1(439.03,349.66) 1(439.03,350.33) 1(439.03,401.2) 1(439.03,401.87) 1(439.03,402.54) 1(439.7,320.21) 1(439.7,320.88) 1(439.7,321.55) 1(439.7,322.22) 1(439.7,348.32) 1(440.37,142.18) 1(440.37,142.85) 1(440.37,143.52) 1(441.04,87.3) 1(441.04,88.64) 1(441.04,142.85) 1(441.04,266) 1(441.04,266.67) 1(441.04,267.34) 1(441.71,59.19) 1(441.71,59.86) 1(441.71,61.2) 1(441.71,144.19) 1(441.71,144.86) 1(441.71,319.54) 1(441.71,320.21) 1(441.71,349.66) 1(441.71,402.54) 1(442.38,6.31) 1(442.38,265.33) 1(442.38,266) 1(442.38,266.67) 1(442.38,320.88) 1(442.38,347.65) 1(442.38,348.32) 1(442.38,348.99) 1(442.38,401.2) 1(443.05,87.97) 1(443.05,145.53) 1(443.05,263.99) 1(443.05,264.66) 1(443.05,265.33) 1(443.05,266) 1(443.05,400.53) 1(443.72,264.66) 1(443.72,318.87) 1(443.72,319.54) 1(443.72,401.87) 1(444.38,59.86) 1(444.38,60.53) 1(444.38,61.2) 1(444.38,61.87) 1(444.38,146.2) 1(444.38,263.32) 1(444.38,264.66) 1(444.38,265.33) 1(445.05,146.2) 1(445.05,146.87) 1(445.05,262.65) 1(445.05,318.87) 1(445.05,320.21) 1(445.05,346.98) 1(445.05,347.65) 1(445.05,348.32) 1(445.05,348.99) 1(445.72,88.64) 1(446.39,6.98) 1(446.39,146.2) 1(446.39,399.86) 1(446.39,400.53) 1(447.06,61.2) 1(447.06,61.87) 1(447.06,62.54) 1(447.06,89.31) 1(447.06,146.87) 1(447.06,148.2) 1(447.06,261.98) 1(447.06,319.54) 1(447.06,399.86) 1(447.73,91.31) 1(447.73,146.87) 1(447.73,147.54) 1(447.73,148.2) 1(447.73,148.87) 1(447.73,260.65) 1(447.73,261.31) 1(447.73,346.31) 1(447.73,346.98) 1(447.73,347.65) 1(448.4,61.87) 1(448.4,89.98) 1(448.4,148.2) 1(448.4,148.87) 1(448.4,149.54) 1(448.4,261.31) 1(448.4,399.86) 1(448.4,401.2) 1(449.07,7.65) 1(449.07,8.99) 1(449.07,63.2) 1(449.07,90.65) 1(449.07,91.31) 1(449.07,91.98) 1(449.07,150.21) 1(449.07,259.98) 1(449.07,260.65) 1(449.07,399.86) 1(449.74,148.87) 1(449.74,261.31) 1(449.74,316.87) 1(449.74,318.2) 1(449.74,318.87) 1(449.74,345.65) 1(449.74,346.31) 1(449.74,346.98) 1(450.41,150.88) 1(450.41,259.31) 1(450.41,259.98) 1(450.41,260.65) 1(451.08,63.87) 1(451.08,91.31) 1(451.08,92.65) 1(451.08,151.55) 1(451.08,258.64) 1(451.08,259.31) 1(451.08,259.98) 1(451.08,316.2) 1(451.08,316.87) 1(451.08,317.54) 1(451.75,8.99) 1(451.75,91.98) 1(451.75,151.55) 1(451.75,152.22) 1(451.75,257.3) 1(451.75,257.97) 1(451.75,258.64) 1(451.75,259.31) 1(451.75,344.31) 1(451.75,344.98) 1(451.75,346.31) 1(452.42,8.32) 1(452.42,9.66) 1(452.42,10.33) 1(452.42,152.22) 1(452.42,152.89) 1(452.42,258.64) 1(452.42,315.53) 1(452.42,316.2) 1(452.42,400.53) 1(453.09,64.54) 1(453.09,91.98) 1(453.09,92.65) 1(453.09,93.32) 1(453.09,151.55) 1(453.09,153.56) 1(453.09,256.63) 1(453.09,314.86) 1(453.09,316.87) 1(453.75,63.87) 1(453.75,93.32) 1(453.75,152.22) 1(453.75,152.89) 1(453.75,153.56) 1(453.75,154.23) 1(453.75,255.96) 1(454.42,8.99) 1(454.42,63.87) 1(454.42,152.89) 1(454.42,154.23) 1(454.42,154.9) 1(454.42,255.29) 1(454.42,255.96) 1(454.42,256.63) 1(454.42,316.2) 1(454.42,343.64) 1(454.42,399.86) 1(455.09,9.66) 1(455.09,10.33) 1(455.09,11) 1(455.09,65.21) 1(455.09,92.65) 1(455.09,94.66) 1(455.09,153.56) 1(455.09,154.23) 1(455.09,154.9) 1(455.09,155.57) 1(455.09,254.62) 1(455.09,255.29) 1(455.09,256.63) 1(455.09,314.19) 1(455.09,314.86) 1(455.09,315.53) 1(455.09,397.85) 1(455.76,9.66) 1(455.76,10.33) 1(455.76,64.54) 1(455.76,93.32) 1(455.76,94.66) 1(455.76,156.24) 1(455.76,253.28) 1(455.76,253.95) 1(455.76,255.29) 1(455.76,255.96) 1(455.76,314.86) 1(455.76,342.97) 1(455.76,344.31) 1(455.76,399.19) 1(456.43,10.33) 1(456.43,154.9) 1(456.43,155.57) 1(456.43,156.24) 1(456.43,156.91) 1(456.43,157.57) 1(456.43,253.95) 1(456.43,254.62) 1(456.43,313.52) 1(456.43,314.19) 1(456.43,315.53) 1(456.43,344.31) 1(457.1,9.66) 1(457.1,93.99) 1(457.1,155.57) 1(457.1,156.24) 1(457.1,156.91) 1(457.1,158.24) 1(457.1,252.61) 1(457.1,253.28) 1(457.1,254.62) 1(457.77,9.66) 1(457.77,11) 1(457.77,64.54) 1(457.77,65.21) 1(457.77,65.88) 1(457.77,156.91) 1(457.77,157.57) 1(457.77,158.24) 1(457.77,158.91) 1(457.77,250.61) 1(457.77,251.28) 1(457.77,251.94) 1(457.77,253.28) 1(457.77,253.95) 1(457.77,312.85) 1(457.77,342.3) 1(457.77,343.64) 1(457.77,397.18) 1(457.77,397.85) 1(457.77,398.52) 1(458.44,10.33) 1(458.44,11.67) 1(458.44,94.66) 1(458.44,96) 1(458.44,157.57) 1(458.44,158.24) 1(458.44,158.91) 1(458.44,159.58) 1(458.44,249.94) 1(458.44,313.52) 1(459.11,65.21) 1(459.11,65.88) 1(459.11,66.55) 1(459.11,312.85) 1(459.11,314.19) 1(459.11,342.97) 1(459.11,343.64) 1(459.78,11.67) 1(459.78,12.34) 1(459.78,95.33) 1(459.78,96) 1(459.78,96.67) 1(459.78,249.27) 1(459.78,249.94) 1(459.78,396.51) 1(459.78,397.18) 1(459.78,397.85) 1(460.45,11) 1(460.45,65.88) 1(460.45,67.22) 1(460.45,97.34) 1(460.45,313.52) 1(460.45,341.63) 1(461.12,66.55) 1(461.12,67.22) 1(461.12,67.89) 1(461.12,96) 1(461.12,97.34) 1(461.12,246.59) 1(461.12,247.26) 1(461.12,249.94) 1(461.12,340.96) 1(461.12,342.3) 1(461.12,342.97) 1(461.79,67.22) 1(461.79,96.67) 1(461.79,98.01) 1(461.79,247.26) 1(461.79,248.6) 1(461.79,312.85) 1(461.79,341.63) 1(462.46,66.55) 1(462.46,68.56) 1(462.46,310.84) 1(462.46,340.29) 1(462.46,340.96) 1(462.46,342.3) 1(463.12,11.67) 1(463.12,12.34) 1(463.12,96.67) 1(463.12,97.34) 1(463.12,98.01) 1(463.12,98.68) 1(463.12,247.93) 1(463.12,310.17) 1(463.12,310.84) 1(463.12,311.51) 1(463.12,312.18) 1(463.12,341.63) 1(463.12,395.84) 1(463.12,396.51) 1(463.12,397.18) 1(463.79,11.67) 1(463.79,395.17) 1(464.46,11.67) 1(464.46,69.23) 1(464.46,98.68) 1(464.46,99.35) 1(464.46,309.5) 1(464.46,310.17) 1(464.46,310.84) 1(464.46,339.62) 1(464.46,340.29) 1(464.46,340.96) 1(465.13,98.01) 1(465.13,395.17) 1(465.13,395.84) 1(465.13,396.51) 1(465.8,68.56) 1(465.8,69.9) 1(465.8,99.35) 1(465.8,100.02) 1(465.8,308.83) 1(465.8,309.5) 1(465.8,310.17) 1(465.8,338.95) 1(465.8,340.29) 1(465.8,394.5) 1(466.47,68.56) 1(466.47,98.68) 1(466.47,100.02) 1(466.47,308.83) 1(466.47,309.5) 1(467.14,12.34) 1(467.14,69.23) 1(467.14,70.57) 1(467.14,307.5) 1(467.14,394.5) 1(467.14,395.84) 1(467.81,13.01) 1(467.81,99.35) 1(467.81,307.5) 1(467.81,308.83) 1(467.81,338.28) 1(468.48,69.23) 1(468.48,69.9) 1(468.48,70.57) 1(468.48,71.24) 1(468.48,100.02) 1(468.48,102.02) 1(468.48,306.83) 1(468.48,337.61) 1(468.48,393.83) 1(469.15,100.68) 1(469.15,308.17) 1(469.15,393.83) 1(469.15,395.17) 1(469.82,13.68) 1(469.82,15.02) 1(469.82,69.9) 1(469.82,71.24) 1(469.82,102.02) 1(469.82,306.83) 1(469.82,336.94) 1(470.49,70.57) 1(470.49,71.91) 1(470.49,101.35) 1(470.49,102.69) 1(470.49,306.16) 1(470.49,307.5) 1(471.16,15.68) 1(471.16,103.36) 1(471.16,305.49) 1(471.16,306.16) 1(471.16,336.28) 1(471.16,337.61) 1(471.83,14.35) 1(471.83,15.02) 1(471.83,71.24) 1(471.83,71.91) 1(471.83,72.57) 1(471.83,102.02) 1(471.83,102.69) 1(471.83,104.03) 1(471.83,305.49) 1(471.83,306.16) 1(471.83,306.83) 1(471.83,336.94) 1(471.83,337.61) 1(471.83,394.5) 1(472.49,102.69) 1(472.49,103.36) 1(472.49,104.7) 1(472.49,304.15) 1(472.49,335.61) 1(473.16,71.91) 1(473.16,72.57) 1(473.16,73.24) 1(473.16,103.36) 1(473.16,104.03) 1(473.16,104.7) 1(473.16,105.37) 1(473.16,336.28) 1(473.16,336.94) 1(473.16,391.83) 1(473.16,392.5) 1(473.16,393.83) 1(473.83,15.02) 1(473.83,15.68) 1(473.83,16.35) 1(473.83,303.48) 1(473.83,304.15) 1(473.83,304.82) 1(473.83,305.49) 1(474.5,17.02) 1(474.5,72.57) 1(474.5,73.24) 1(474.5,73.91) 1(474.5,74.58) 1(474.5,104.03) 1(474.5,105.37) 1(474.5,302.81) 1(474.5,303.48) 1(474.5,334.27) 1(474.5,335.61) 1(474.5,336.28) 1(475.17,15.68) 1(475.17,16.35) 1(475.17,73.24) 1(475.17,104.7) 1(475.17,106.04) 1(475.17,302.81) 1(475.17,304.15) 1(475.17,391.83) 1(475.17,392.5) 1(475.17,393.17) 1(475.84,17.02) 1(475.84,17.69) 1(475.84,106.04) 1(475.84,302.14) 1(475.84,303.48) 1(475.84,333.6) 1(475.84,334.27) 1(475.84,335.61) 1(475.84,391.16) 1(476.51,75.25) 1(476.51,105.37) 1(476.51,106.71) 1(476.51,302.14) 1(476.51,334.94) 1(476.51,392.5) 1(477.18,16.35) 1(477.18,17.69) 1(477.18,75.92) 1(477.18,106.04) 1(477.18,106.71) 1(477.18,107.38) 1(477.18,108.05) 1(477.18,302.81) 1(477.18,391.16) 1(477.85,18.36) 1(477.85,106.71) 1(477.85,107.38) 1(477.85,108.05) 1(477.85,108.72) 1(477.85,302.14) 1(477.85,332.93) 1(477.85,334.27) 1(477.85,390.49) 1(477.85,391.83) 1(478.52,17.02) 1(478.52,75.25) 1(478.52,107.38) 1(478.52,301.47) 1(478.52,332.26) 1(479.19,18.36) 1(479.19,75.92) 1(479.19,76.59) 1(479.19,108.05) 1(479.19,108.72) 1(479.19,109.39) 1(479.19,331.59) 1(479.19,389.82) 1(479.19,390.49) 1(479.19,391.16) 1(479.86,19.03) 1(479.86,75.25) 1(479.86,75.92) 1(479.86,77.26) 1(479.86,298.8) 1(479.86,299.46) 1(479.86,300.8) 1(480.53,76.59) 1(480.53,77.26) 1(480.53,77.93) 1(480.53,108.72) 1(480.53,109.39) 1(480.53,110.05) 1(480.53,298.13) 1(480.53,298.8) 1(480.53,299.46) 1(480.53,300.13) 1(481.2,17.69) 1(481.2,19.03) 1(481.2,109.39) 1(481.2,110.05) 1(481.2,298.13) 1(481.2,299.46) 1(481.2,330.25) 1(481.2,330.92) 1(481.2,331.59) 1(481.2,389.15) 1(481.2,389.82) 1(481.86,76.59) 1(481.86,77.26) 1(481.86,77.93) 1(481.86,78.6) 1(481.86,110.05) 1(481.86,296.79) 1(481.86,298.8) 1(481.86,330.92) 1(481.86,331.59) 1(481.86,390.49) 1(482.53,18.36) 1(482.53,110.72) 1(482.53,298.13) 1(482.53,389.15) 1(483.2,296.12) 1(483.2,329.58) 1(483.2,330.92) 1(483.87,19.03) 1(483.87,77.93) 1(483.87,78.6) 1(483.87,79.27) 1(483.87,79.94) 1(483.87,111.39) 1(483.87,296.12) 1(483.87,296.79) 1(483.87,297.46) 1(483.87,328.91) 1(483.87,329.58) 1(483.87,330.25) 1(483.87,389.82) 1(484.54,19.7) 1(484.54,21.04) 1(484.54,78.6) 1(484.54,79.27) 1(484.54,112.06) 1(484.54,296.79) 1(484.54,330.25) 1(484.54,389.15) 1(485.21,79.27) 1(485.21,80.61) 1(485.21,112.73) 1(485.21,296.12) 1(485.21,328.24) 1(485.21,329.58) 1(485.88,81.28) 1(485.88,114.74) 1(485.88,293.44) 1(485.88,294.11) 1(485.88,327.57) 1(486.55,20.37) 1(486.55,21.04) 1(486.55,21.71) 1(486.55,81.94) 1(486.55,113.4) 1(486.55,114.07) 1(486.55,114.74) 1(486.55,115.41) 1(486.55,292.77) 1(486.55,294.11) 1(486.55,294.78) 1(486.55,295.45) 1(486.55,326.91) 1(486.55,387.14) 1(486.55,388.48) 1(487.22,114.74) 1(487.22,115.41) 1(487.22,116.08) 1(487.22,292.1) 1(487.22,293.44) 1(487.22,294.11) 1(487.22,387.14) 1(487.89,21.04) 1(487.89,21.71) 1(487.89,22.38) 1(487.89,81.28) 1(487.89,82.61) 1(487.89,115.41) 1(487.89,116.08) 1(487.89,116.75) 1(487.89,291.43) 1(487.89,292.1) 1(487.89,292.77) 1(487.89,293.44) 1(487.89,326.24) 1(487.89,386.47) 1(487.89,387.81) 1(488.56,81.28) 1(488.56,81.94) 1(488.56,83.28) 1(488.56,116.08) 1(488.56,116.75) 1(488.56,158.91) 1(488.56,159.58) 